# Altium footprint library Standard2.PcbLib: 423 footprints (part 5 of 27)
Each footprint in its own frame and in the unit in brackets; x right, y up, seen from the top. Pads: shape width x height; smd on the part's side, far side on the other; paste and mask are expansions set on the pad; w line width, h text height; cw(c..) or ccw(c..) is an arc to the next point about the centre after c.
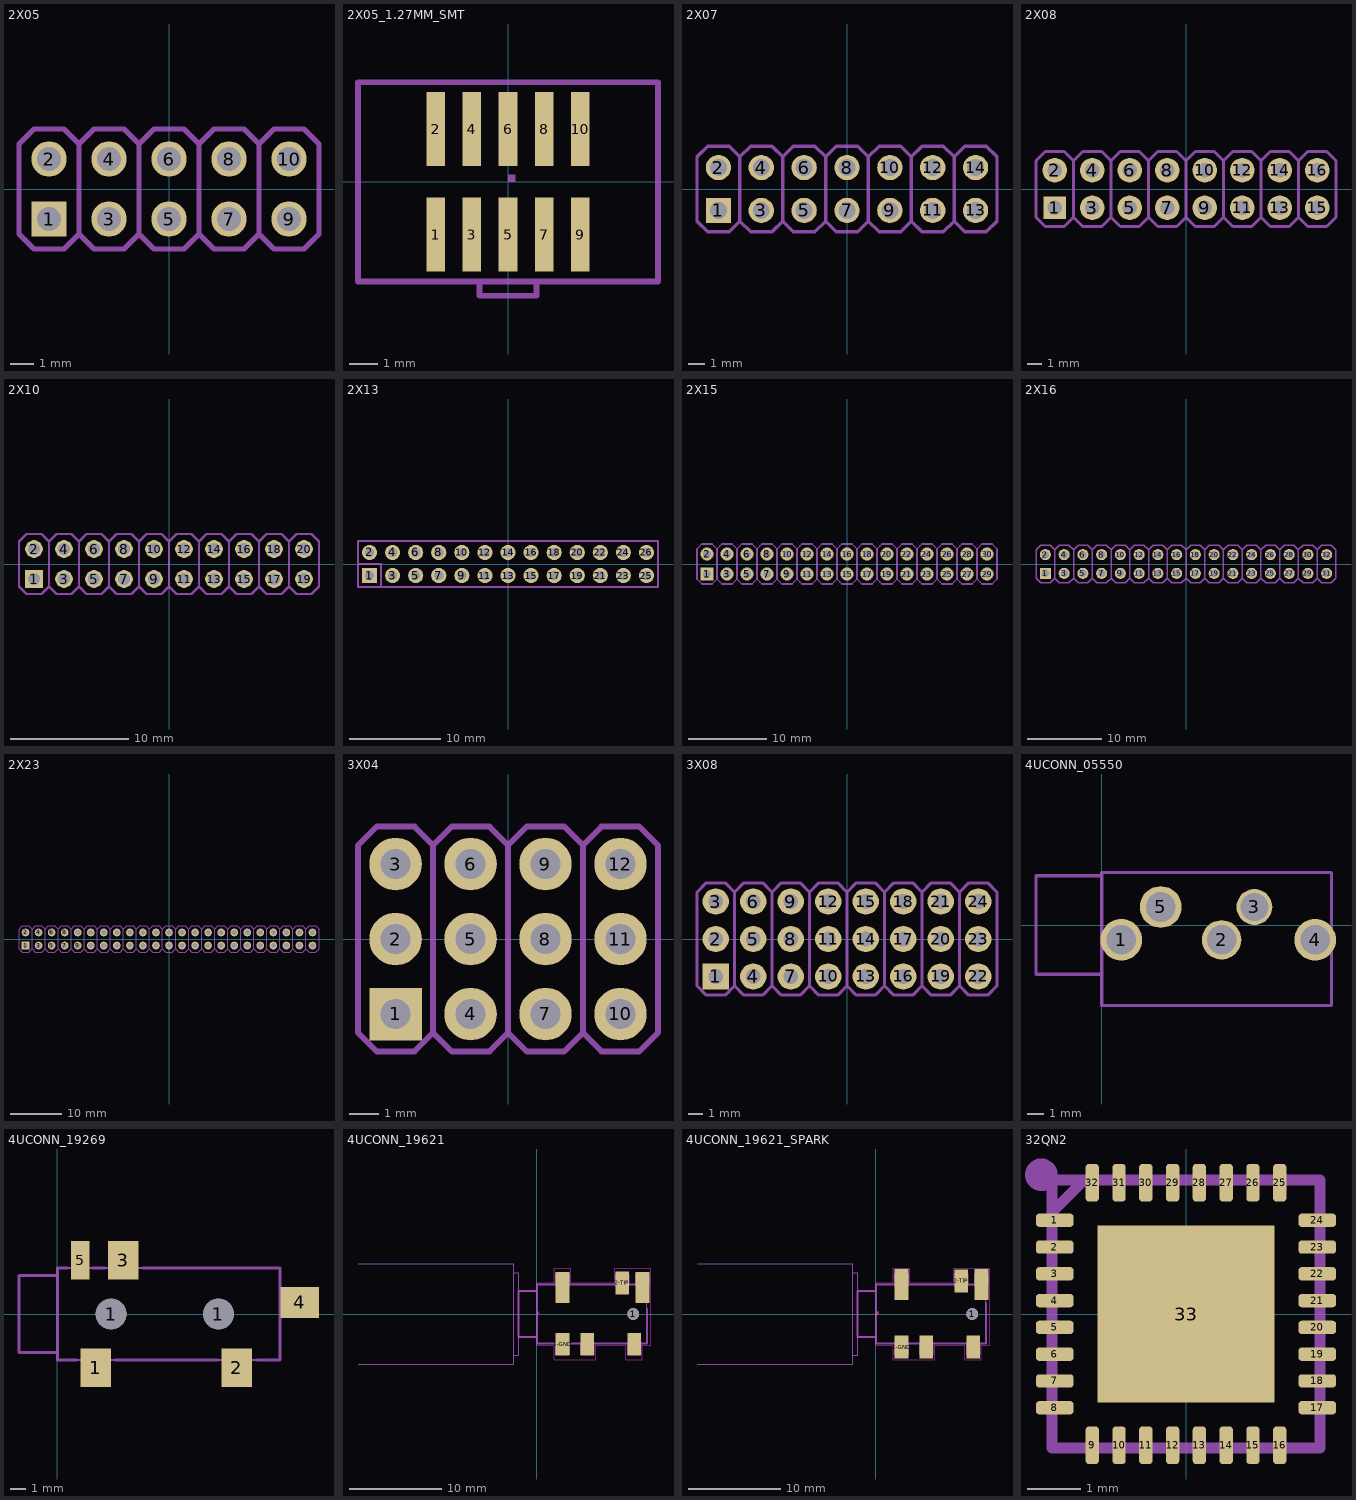
[diagram p4: the footprints below, top view; thin cyan lines are the x and y axes]

## 2X05 [mm]
pads (10):
  rect 1.5x1.5 hole 1: 1(-5.08,-1.27)
  round 1.5 hole 1: 2(-5.08,1.27) 3(-2.54,-1.27) 4(-2.54,1.27) 5(0,-1.27) 6(0,1.27) 7(2.54,-1.27) 8(2.54,1.27) 9(5.08,-1.27) 10(5.08,1.27)
Mechanical 2:
  lines w0.203: -3.81,-1.905 -4.445,-2.54 -5.715,-2.54 -6.35,-1.905 -6.35,1.905 -5.715,2.54 -4.445,2.54 -3.81,1.905 ; -3.81,-1.905 -3.175,-2.54 -1.905,-2.54 -1.27,-1.905 ; -3.81,-1.905 -3.81,1.905 ; -3.81,1.905 -3.175,2.54 -1.905,2.54 -1.27,1.905 ; -1.27,-1.905 -0.635,-2.54 0.635,-2.54 1.27,-1.905 ; -1.27,-1.905 -1.27,1.905 ; -1.27,1.905 -0.635,2.54 0.635,2.54 1.27,1.905 ; 1.27,-1.905 1.905,-2.54 3.175,-2.54 3.81,-1.905 ; 1.27,-1.905 1.27,1.905 ; 1.27,1.905 1.905,2.54 3.175,2.54 3.81,1.905 ; 3.81,-1.905 3.81,1.905 ; 3.81,-1.905 4.445,-2.54 5.715,-2.54 6.35,-1.905 6.35,1.905 5.715,2.54 4.445,2.54 3.81,1.905
Mechanical 18:
  rectangle: -5.334,-1.524 -4.826,-1.016
  rectangle: -5.334,1.016 -4.826,1.524
  rectangle: -2.794,1.016 -2.286,1.524
  rectangle: -2.794,-1.524 -2.286,-1.016
  rectangle: -0.254,1.016 0.254,1.524
  rectangle: -0.254,-1.524 0.254,-1.016
  rectangle: 2.286,1.016 2.794,1.524
  rectangle: 2.286,-1.524 2.794,-1.016
  rectangle: 4.826,1.016 5.334,1.524
  rectangle: 4.826,-1.524 5.334,-1.016

## 2X05_1.27MM_SMT [mm]
pads (10):
  rect 0.65x2.6 smd: 1(-2.54,-1.85) 2(-2.54,1.85) 3(-1.27,-1.85) 4(-1.27,1.85) 5(0,-1.85) 6(0,1.85) 7(1.27,-1.85) 8(1.27,1.85) 9(2.54,-1.85) 10(2.54,1.85)
Mechanical 2:
  region: 0,0 0.254,0 0.254,0.254 0,0.254
  lines w0.203: -1,-3.5 1,-3.5 ; -1,-3.5 -5.27,-3.5 -5.27,3.5 5.27,3.5 5.27,-3.5 1,-3.5 ; -1,-3.5 -1,-4 1,-4 1,-3.5

## 2X07 [mm]
pads (14):
  rect 1.5x1.5 hole 1: 1(-7.62,-1.27)
  round 1.5 hole 1: 2(-7.62,1.27) 3(-5.08,-1.27) 4(-5.08,1.27) 5(-2.54,-1.27) 6(-2.54,1.27) 7(0,-1.27) 8(0,1.27) 9(2.54,-1.27) 10(2.54,1.27) 11(5.08,-1.27) 12(5.08,1.27) 13(7.62,-1.27) 14(7.62,1.27)
Mechanical 2:
  lines w0.203: -6.35,-1.905 -6.985,-2.54 -8.255,-2.54 -8.89,-1.905 -8.89,1.905 -8.255,2.54 -6.985,2.54 -6.35,1.905 ; -6.35,-1.905 -5.715,-2.54 -4.445,-2.54 -3.81,-1.905 ; -6.35,-1.905 -6.35,1.905 ; -6.35,1.905 -5.715,2.54 -4.445,2.54 -3.81,1.905 ; -3.81,-1.905 -3.175,-2.54 -1.905,-2.54 -1.27,-1.905 ; -3.81,-1.905 -3.81,1.905 ; -3.81,1.905 -3.175,2.54 -1.905,2.54 -1.27,1.905 ; -1.27,-1.905 -0.635,-2.54 0.635,-2.54 1.27,-1.905 ; -1.27,-1.905 -1.27,1.905 ; -1.27,1.905 -0.635,2.54 0.635,2.54 1.27,1.905 ; 1.27,-1.905 1.905,-2.54 3.175,-2.54 3.81,-1.905 ; 1.27,-1.905 1.27,1.905 ; 1.27,1.905 1.905,2.54 3.175,2.54 3.81,1.905 ; 3.81,-1.905 4.445,-2.54 5.715,-2.54 6.35,-1.905 ; 3.81,-1.905 3.81,1.905 ; 3.81,1.905 4.445,2.54 5.715,2.54 6.35,1.905 ; 6.35,-1.905 6.35,1.905 ; 6.35,-1.905 6.985,-2.54 8.255,-2.54 8.89,-1.905 8.89,1.905 8.255,2.54 6.985,2.54 6.35,1.905
Mechanical 18:
  rectangle: -7.874,-1.524 -7.366,-1.016
  rectangle: -7.874,1.016 -7.366,1.524
  rectangle: -5.334,1.016 -4.826,1.524
  rectangle: -5.334,-1.524 -4.826,-1.016
  rectangle: -2.794,1.016 -2.286,1.524
  rectangle: -2.794,-1.524 -2.286,-1.016
  rectangle: -0.254,1.016 0.254,1.524
  rectangle: 2.286,1.016 2.794,1.524
  rectangle: 4.826,1.016 5.334,1.524
  rectangle: -0.254,-1.524 0.254,-1.016
  rectangle: 2.286,-1.524 2.794,-1.016
  rectangle: 4.826,-1.524 5.334,-1.016
  rectangle: 7.366,1.016 7.874,1.524
  rectangle: 7.366,-1.524 7.874,-1.016

## 2X08 [mil]
pads (16):
  rect 59.05x59.05 hole 39.37: 1(-350,-50)
  round 66 hole 39.37: 2(-350,50) 3(-250,-50) 4(-250,50) 5(-150,-50) 6(-150,50) 7(-50,-50) 8(-50,50) 9(50,-50) 10(50,50) 11(150,-50) 12(150,50) 13(250,-50) 14(250,50) 15(350,-50) 16(350,50)
Mechanical 2:
  lines w8: -300,-75 -325,-100 -375,-100 -400,-75 -400,75 -375,100 -325,100 -300,75 ; -300,-75 -275,-100 -225,-100 -200,-75 ; -300,-75 -300,75 ; -300,75 -275,100 -225,100 -200,75 ; -200,-75 -175,-100 -125,-100 -100,-75 ; -200,-75 -200,75 ; -200,75 -175,100 -125,100 -100,75 ; -100,-75 -75,-100 -25,-100 0,-75 ; -100,-75 -100,75 ; -100,75 -75,100 -25,100 0,75 ; 0,-75 25,-100 75,-100 100,-75 ; 0,-75 0,75 ; 0,75 25,100 75,100 100,75 ; 100,-75 125,-100 175,-100 200,-75 ; 100,-75 100,75 ; 100,75 125,100 175,100 200,75 ; 200,-75 200,75 ; 200,-75 225,-100 275,-100 300,-75 ; 200,75 225,100 275,100 300,75 ; 300,-75 300,75 ; 300,-75 325,-100 375,-100 400,-75 400,75 375,100 325,100 300,75
Mechanical 18:
  rectangle: -360,-60 -340,-40
  rectangle: -360,40 -340,60
  rectangle: -260,40 -240,60
  rectangle: -260,-60 -240,-40
  rectangle: -160,40 -140,60
  rectangle: -160,-60 -140,-40
  rectangle: -60,40 -40,60
  rectangle: 40,40 60,60
  rectangle: 140,40 160,60
  rectangle: -60,-60 -40,-40
  rectangle: 40,-60 60,-40
  rectangle: 140,-60 160,-40
  rectangle: 240,40 260,60
  rectangle: 240,-60 260,-40
  rectangle: 340,40 360,60
  rectangle: 340,-60 360,-40

## 2X10 [mm]
pads (20):
  rect 1.5x1.5 hole 1: 1(-11.43,-1.27)
  round 1.5 hole 1: 2(-11.43,1.27) 3(-8.89,-1.27) 4(-8.89,1.27) 5(-6.35,-1.27) 6(-6.35,1.27) 7(-3.81,-1.27) 8(-3.81,1.27) 9(-1.27,-1.27) 10(-1.27,1.27) 11(1.27,-1.27) 12(1.27,1.27) 13(3.81,-1.27) 14(3.81,1.27) 15(6.35,-1.27) 16(6.35,1.27) 17(8.89,-1.27) 18(8.89,1.27) 19(11.43,-1.27) 20(11.43,1.27)
Mechanical 2:
  lines w0.203: -10.16,-1.905 -10.795,-2.54 -12.065,-2.54 -12.7,-1.905 -12.7,1.905 -12.065,2.54 -10.795,2.54 -10.16,1.905 ; -10.16,-1.905 -9.525,-2.54 -8.255,-2.54 -7.62,-1.905 ; -10.16,-1.905 -10.16,1.905 ; -10.16,1.905 -9.525,2.54 -8.255,2.54 -7.62,1.905 ; -7.62,-1.905 -6.985,-2.54 -5.715,-2.54 -5.08,-1.905 ; -7.62,-1.905 -7.62,1.905 ; -7.62,1.905 -6.985,2.54 -5.715,2.54 -5.08,1.905 ; -5.08,-1.905 -4.445,-2.54 -3.175,-2.54 -2.54,-1.905 ; -5.08,-1.905 -5.08,1.905 ; -5.08,1.905 -4.445,2.54 -3.175,2.54 -2.54,1.905 ; -2.54,-1.905 -1.905,-2.54 -0.635,-2.54 0,-1.905 ; -2.54,-1.905 -2.54,1.905 ; -2.54,1.905 -1.905,2.54 -0.635,2.54 0,1.905 ; 0,-1.905 0.635,-2.54 1.905,-2.54 2.54,-1.905 ; 0,-1.905 0,1.905 ; 0,1.905 0.635,2.54 1.905,2.54 2.54,1.905 ; 2.54,-1.905 3.175,-2.54 4.445,-2.54 5.08,-1.905 ; 2.54,-1.905 2.54,1.905 ; 2.54,1.905 3.175,2.54 4.445,2.54 5.08,1.905 ; 5.08,-1.905 5.715,-2.54 6.985,-2.54 7.62,-1.905 ; 5.08,-1.905 5.08,1.905 ; 5.08,1.905 5.715,2.54 6.985,2.54 7.62,1.905 ; 7.62,-1.905 8.255,-2.54 9.525,-2.54 10.16,-1.905 ; 7.62,-1.905 7.62,1.905 ; 7.62,1.905 8.255,2.54 9.525,2.54 10.16,1.905 ; 10.16,-1.905 10.16,1.905 ; 10.16,-1.905 10.795,-2.54 12.065,-2.54 12.7,-1.905 12.7,1.905 12.065,2.54 10.795,2.54 10.16,1.905
Mechanical 18:
  rectangle: -11.684,-1.524 -11.176,-1.016
  rectangle: -11.684,1.016 -11.176,1.524
  rectangle: -9.144,1.016 -8.636,1.524
  rectangle: -9.144,-1.524 -8.636,-1.016
  rectangle: -6.604,1.016 -6.096,1.524
  rectangle: -6.604,-1.524 -6.096,-1.016
  rectangle: -4.064,1.016 -3.556,1.524
  rectangle: -1.524,1.016 -1.016,1.524
  rectangle: 1.016,1.016 1.524,1.524
  rectangle: -4.064,-1.524 -3.556,-1.016
  rectangle: -1.524,-1.524 -1.016,-1.016
  rectangle: 1.016,-1.524 1.524,-1.016
  rectangle: 3.556,1.016 4.064,1.524
  rectangle: 3.556,-1.524 4.064,-1.016
  rectangle: 6.096,1.016 6.604,1.524
  rectangle: 6.096,-1.524 6.604,-1.016
  rectangle: 8.636,1.016 9.144,1.524
  rectangle: 8.636,-1.524 9.144,-1.016
  rectangle: 11.176,1.016 11.684,1.524
  rectangle: 11.176,-1.524 11.684,-1.016

## 2X13 [mil]
pads (26):
  rect 66x66 hole 39.37: 1(-600,-50)
  round 66 hole 39.37: 2(-600,50) 3(-500,-50) 4(-500,50) 5(-400,-50) 6(-400,50) 7(-300,-50) 8(-300,50) 9(-200,-50) 10(-200,50) 11(-100,-50) 12(-100,50) 13(0,-50) 14(0,50) 15(100,-50) 16(100,50) 17(200,-50) 18(200,50) 19(300,-50) 20(300,50) 21(400,-50) 22(400,50) 23(500,-50) 24(500,50) 25(600,-50) 26(600,50)
Mechanical 2:
  lines w8: -650,0 -650,-100 -550,-100 ; -650,0 -650,100 650,100 650,-100 -550,-100 ; -650,0 -550,0 -550,-100
Mechanical 18:
  rectangle: -610,-60 -590,-40
  rectangle: -610,40 -590,60
  rectangle: -510,40 -490,60
  rectangle: -510,-60 -490,-40
  rectangle: -410,40 -390,60
  rectangle: -410,-60 -390,-40
  rectangle: -310,40 -290,60
  rectangle: -210,40 -190,60
  rectangle: -110,40 -90,60
  rectangle: -310,-60 -290,-40
  rectangle: -210,-60 -190,-40
  rectangle: -110,-60 -90,-40
  rectangle: -10,40 10,60
  rectangle: -10,-60 10,-40
  rectangle: 90,40 110,60
  rectangle: 90,-60 110,-40
  rectangle: 190,40 210,60
  rectangle: 190,-60 210,-40
  rectangle: 290,40 310,60
  rectangle: 290,-60 310,-40
  rectangle: 390,40 410,60
  rectangle: 390,-60 410,-40
  rectangle: 490,40 510,60
  rectangle: 490,-60 510,-40
  rectangle: 590,40 610,60
  rectangle: 590,-60 610,-40

## 2X15 [mil]
pads (30):
  rect 66x66 hole 39.37: 1(-700,-50)
  round 66 hole 39.37: 2(-700,50) 3(-600,-50) 4(-600,50) 5(-500,-50) 6(-500,50) 7(-400,-50) 8(-400,50) 9(-300,-50) 10(-300,50) 11(-200,-50) 12(-200,50) 13(-100,-50) 14(-100,50) 15(0,-50) 16(0,50) 17(100,-50) 18(100,50) 19(200,-50) 20(200,50) 21(300,-50) 22(300,50) 23(400,-50) 24(400,50) 25(500,-50) 26(500,50) 27(600,-50) 28(600,50) 29(700,-50) 30(700,50)
Mechanical 2:
  lines w8: -650,-75 -675,-100 -725,-100 -750,-75 -750,75 -725,100 -675,100 -650,75 ; -650,-75 -625,-100 -575,-100 -550,-75 ; -650,-75 -650,75 ; -650,75 -625,100 -575,100 -550,75 ; -550,-75 -525,-100 -475,-100 -450,-75 ; -550,-75 -550,75 ; -550,75 -525,100 -475,100 -450,75 ; -450,-75 -425,-100 -375,-100 -350,-75 ; -450,-75 -450,75 ; -450,75 -425,100 -375,100 -350,75 ; -350,-75 -325,-100 -275,-100 -250,-75 ; -350,-75 -350,75 ; -350,75 -325,100 -275,100 -250,75 ; -250,-75 -225,-100 -175,-100 -150,-75 ; -250,-75 -250,75 ; -250,75 -225,100 -175,100 -150,75 ; -150,-75 -125,-100 -75,-100 -50,-75 ; -150,-75 -150,75 ; -150,75 -125,100 -75,100 -50,75 ; -50,-75 -25,-100 25,-100 50,-75 ; -50,-75 -50,75 ; -50,75 -25,100 25,100 50,75 ; 50,-75 75,-100 125,-100 150,-75 ; 50,-75 50,75 ; 50,75 75,100 125,100 150,75 ; 150,-75 175,-100 225,-100 250,-75 ; 150,-75 150,75 ; 150,75 175,100 225,100 250,75 ; 250,-75 275,-100 325,-100 350,-75 ; 250,-75 250,75 ; 250,75 275,100 325,100 350,75 ; 350,-75 375,-100 425,-100 450,-75 ; 350,-75 350,75 ; 350,75 375,100 425,100 450,75 ; 450,-75 475,-100 525,-100 550,-75 ; 450,-75 450,75 ; 450,75 475,100 525,100 550,75 ; 550,-75 575,-100 625,-100 650,-75 ; 550,-75 550,75 ; 550,75 575,100 625,100 650,75 ; 650,-75 675,-100 725,-100 750,-75 750,75 725,100 675,100 650,75 ; 650,-75 650,75
Mechanical 18:
  rectangle: -710,-60 -690,-40
  rectangle: -710,40 -690,60
  rectangle: -610,40 -590,60
  rectangle: -610,-60 -590,-40
  rectangle: -510,40 -490,60
  rectangle: -510,-60 -490,-40
  rectangle: -410,40 -390,60
  rectangle: -310,40 -290,60
  rectangle: -210,40 -190,60
  rectangle: -410,-60 -390,-40
  rectangle: -310,-60 -290,-40
  rectangle: -210,-60 -190,-40
  rectangle: -110,40 -90,60
  rectangle: -110,-60 -90,-40
  rectangle: -10,40 10,60
  rectangle: -10,-60 10,-40
  rectangle: 90,40 110,60
  rectangle: 90,-60 110,-40
  rectangle: 190,40 210,60
  rectangle: 190,-60 210,-40
  rectangle: 290,40 310,60
  rectangle: 290,-60 310,-40
  rectangle: 390,40 410,60
  rectangle: 390,-60 410,-40
  rectangle: 490,40 510,60
  rectangle: 490,-60 510,-40
  rectangle: 590,40 610,60
  rectangle: 590,-60 610,-40
  rectangle: 690,40 710,60
  rectangle: 690,-60 710,-40

## 2X16 [mm]
pads (32):
  rect 1.5x1.5 hole 1: 1(-19.05,-1.27)
  round 1.5 hole 1: 2(-19.05,1.27) 3(-16.51,-1.27) 4(-16.51,1.27) 5(-13.97,-1.27) 6(-13.97,1.27) 7(-11.43,-1.27) 8(-11.43,1.27) 9(-8.89,-1.27) 10(-8.89,1.27) 11(-6.35,-1.27) 12(-6.35,1.27) 13(-3.81,-1.27) 14(-3.81,1.27) 15(-1.27,-1.27) 16(-1.27,1.27) 17(1.27,-1.27) 18(1.27,1.27) 19(3.81,-1.27) 20(3.81,1.27) 21(6.35,-1.27) 22(6.35,1.27) 23(8.89,-1.27) 24(8.89,1.27) 25(11.43,-1.27) 26(11.43,1.27) 27(13.97,-1.27) 28(13.97,1.27) 29(16.51,-1.27) 30(16.51,1.27) 31(19.05,-1.27) 32(19.05,1.27)
Mechanical 2:
  lines w0.203: -17.78,-1.905 -18.415,-2.54 -19.685,-2.54 -20.32,-1.905 -20.32,1.905 -19.685,2.54 -18.415,2.54 -17.78,1.905 ; -17.78,-1.905 -17.145,-2.54 -15.875,-2.54 -15.24,-1.905 ; -17.78,-1.905 -17.78,1.905 ; -17.78,1.905 -17.145,2.54 -15.875,2.54 -15.24,1.905 ; -15.24,-1.905 -14.605,-2.54 -13.335,-2.54 -12.7,-1.905 ; -15.24,-1.905 -15.24,1.905 ; -15.24,1.905 -14.605,2.54 -13.335,2.54 -12.7,1.905 ; -12.7,-1.905 -12.065,-2.54 -10.795,-2.54 -10.16,-1.905 ; -12.7,-1.905 -12.7,1.905 ; -12.7,1.905 -12.065,2.54 -10.795,2.54 -10.16,1.905 ; -10.16,-1.905 -9.525,-2.54 -8.255,-2.54 -7.62,-1.905 ; -10.16,-1.905 -10.16,1.905 ; -10.16,1.905 -9.525,2.54 -8.255,2.54 -7.62,1.905 ; -7.62,-1.905 -6.985,-2.54 -5.715,-2.54 -5.08,-1.905 ; -7.62,-1.905 -7.62,1.905 ; -7.62,1.905 -6.985,2.54 -5.715,2.54 -5.08,1.905 ; -5.08,-1.905 -4.445,-2.54 -3.175,-2.54 -2.54,-1.905 ; -5.08,-1.905 -5.08,1.905 ; -5.08,1.905 -4.445,2.54 -3.175,2.54 -2.54,1.905 ; -2.54,-1.905 -1.905,-2.54 -0.635,-2.54 0,-1.905 ; -2.54,-1.905 -2.54,1.905 ; -2.54,1.905 -1.905,2.54 -0.635,2.54 0,1.905 ; 0,-1.905 0.635,-2.54 1.905,-2.54 2.54,-1.905 ; 0,-1.905 0,1.905 ; 0,1.905 0.635,2.54 1.905,2.54 2.54,1.905 ; 2.54,-1.905 3.175,-2.54 4.445,-2.54 5.08,-1.905 ; 2.54,-1.905 2.54,1.905 ; 2.54,1.905 3.175,2.54 4.445,2.54 5.08,1.905 ; 5.08,-1.905 5.715,-2.54 6.985,-2.54 7.62,-1.905 ; 5.08,-1.905 5.08,1.905 ; 5.08,1.905 5.715,2.54 6.985,2.54 7.62,1.905 ; 7.62,-1.905 8.255,-2.54 9.525,-2.54 10.16,-1.905 ; 7.62,-1.905 7.62,1.905 ; 7.62,1.905 8.255,2.54 9.525,2.54 10.16,1.905 ; 10.16,-1.905 10.795,-2.54 12.065,-2.54 12.7,-1.905 ; 10.16,-1.905 10.16,1.905 ; 10.16,1.905 10.795,2.54 12.065,2.54 12.7,1.905 ; 12.7,-1.905 13.335,-2.54 14.605,-2.54 15.24,-1.905 ; 12.7,-1.905 12.7,1.905 ; 12.7,1.905 13.335,2.54 14.605,2.54 15.24,1.905 ; 15.24,-1.905 15.875,-2.54 17.145,-2.54 17.78,-1.905 ; 15.24,-1.905 15.24,1.905 ; 15.24,1.905 15.875,2.54 17.145,2.54 17.78,1.905 ; 17.78,-1.905 18.415,-2.54 19.685,-2.54 20.32,-1.905 20.32,1.905 19.685,2.54 18.415,2.54 17.78,1.905 ; 17.78,-1.905 17.78,1.905
Mechanical 18:
  rectangle: -19.304,-1.524 -18.796,-1.016
  rectangle: -19.304,1.016 -18.796,1.524
  rectangle: -16.764,1.016 -16.256,1.524
  rectangle: -16.764,-1.524 -16.256,-1.016
  rectangle: -14.224,1.016 -13.716,1.524
  rectangle: -14.224,-1.524 -13.716,-1.016
  rectangle: -11.684,1.016 -11.176,1.524
  rectangle: -9.144,1.016 -8.636,1.524
  rectangle: -6.604,1.016 -6.096,1.524
  rectangle: -11.684,-1.524 -11.176,-1.016
  rectangle: -9.144,-1.524 -8.636,-1.016
  rectangle: -6.604,-1.524 -6.096,-1.016
  rectangle: -4.064,1.016 -3.556,1.524
  rectangle: -4.064,-1.524 -3.556,-1.016
  rectangle: -1.524,1.016 -1.016,1.524
  rectangle: -1.524,-1.524 -1.016,-1.016
  rectangle: 1.016,1.016 1.524,1.524
  rectangle: 1.016,-1.524 1.524,-1.016
  rectangle: 3.556,1.016 4.064,1.524
  rectangle: 3.556,-1.524 4.064,-1.016
  rectangle: 6.096,1.016 6.604,1.524
  rectangle: 6.096,-1.524 6.604,-1.016
  rectangle: 8.636,1.016 9.144,1.524
  rectangle: 8.636,-1.524 9.144,-1.016
  rectangle: 11.176,1.016 11.684,1.524
  rectangle: 11.176,-1.524 11.684,-1.016
  rectangle: 13.716,1.016 14.224,1.524
  rectangle: 13.716,-1.524 14.224,-1.016
  rectangle: 16.256,1.016 16.764,1.524
  rectangle: 16.256,-1.524 16.764,-1.016
  rectangle: 18.796,1.016 19.304,1.524
  rectangle: 18.796,-1.524 19.304,-1.016

## 2X23 [mm]
pads (46):
  rect 1.5x1.5 hole 1: 1(-27.94,-1.27)
  round 1.5 hole 1: 2(-27.94,1.27) 3(-25.4,-1.27) 4(-25.4,1.27) 5(-22.86,-1.27) 6(-22.86,1.27) 7(-20.32,-1.27) 8(-20.32,1.27) 9(-17.78,-1.27) 10(-17.78,1.27) 11(-15.24,-1.27) 12(-15.24,1.27) 13(-12.7,-1.27) 14(-12.7,1.27) 15(-10.16,-1.27) 16(-10.16,1.27) 17(-7.62,-1.27) 18(-7.62,1.27) 19(-5.08,-1.27) 20(-5.08,1.27) 21(-2.54,-1.27) 22(-2.54,1.27) 23(0,-1.27) 24(0,1.27) 25(2.54,-1.27) 26(2.54,1.27) 27(5.08,-1.27) 28(5.08,1.27) 29(7.62,-1.27) 30(7.62,1.27) 31(10.16,-1.27) 32(10.16,1.27) 33(12.7,-1.27) 34(12.7,1.27) 35(15.24,-1.27) 36(15.24,1.27) 37(17.78,-1.27) 38(17.78,1.27) 39(20.32,-1.27) 40(20.32,1.27) 41(22.86,-1.27) 42(22.86,1.27) 43(25.4,-1.27) 44(25.4,1.27) 45(27.94,-1.27) 46(27.94,1.27)
Mechanical 2:
  drawing of 162 lines, arcs and shapes, not listed
Mechanical 18:
  rectangle: -28.194,-1.524 -27.686,-1.016
  rectangle: -28.194,1.016 -27.686,1.524
  rectangle: -25.654,1.016 -25.146,1.524
  rectangle: -25.654,-1.524 -25.146,-1.016
  rectangle: -23.114,1.016 -22.606,1.524
  rectangle: -23.114,-1.524 -22.606,-1.016
  rectangle: -20.574,1.016 -20.066,1.524
  rectangle: -18.034,1.016 -17.526,1.524
  rectangle: -15.494,1.016 -14.986,1.524
  rectangle: -20.574,-1.524 -20.066,-1.016
  rectangle: -18.034,-1.524 -17.526,-1.016
  rectangle: -15.494,-1.524 -14.986,-1.016
  rectangle: -12.954,1.016 -12.446,1.524
  rectangle: -12.954,-1.524 -12.446,-1.016
  rectangle: -10.414,1.016 -9.906,1.524
  rectangle: -10.414,-1.524 -9.906,-1.016
  rectangle: -7.874,1.016 -7.366,1.524
  rectangle: -7.874,-1.524 -7.366,-1.016
  rectangle: -5.334,1.016 -4.826,1.524
  rectangle: -5.334,-1.524 -4.826,-1.016
  rectangle: -2.794,1.016 -2.286,1.524
  rectangle: -2.794,-1.524 -2.286,-1.016
  rectangle: -0.254,1.016 0.254,1.524
  rectangle: -0.254,-1.524 0.254,-1.016
  rectangle: 2.286,1.016 2.794,1.524
  rectangle: 2.286,-1.524 2.794,-1.016
  rectangle: 4.826,1.016 5.334,1.524
  rectangle: 4.826,-1.524 5.334,-1.016
  rectangle: 7.366,1.016 7.874,1.524
  rectangle: 7.366,-1.524 7.874,-1.016
  rectangle: 9.906,1.016 10.414,1.524
  rectangle: 9.906,-1.524 10.414,-1.016
  rectangle: 12.446,1.016 12.954,1.524
  rectangle: 12.446,-1.524 12.954,-1.016
  rectangle: 14.986,1.016 15.494,1.524
  rectangle: 14.986,-1.524 15.494,-1.016
  rectangle: 17.526,1.016 18.034,1.524
  rectangle: 17.526,-1.524 18.034,-1.016
  rectangle: 20.066,1.016 20.574,1.524
  rectangle: 20.066,-1.524 20.574,-1.016
  rectangle: 22.606,1.016 23.114,1.524
  rectangle: 22.606,-1.524 23.114,-1.016
  rectangle: 25.146,1.016 25.654,1.524
  rectangle: 25.146,-1.524 25.654,-1.016
  rectangle: 27.686,1.016 28.194,1.524
  rectangle: 27.686,-1.524 28.194,-1.016

## 3X04 [mil]
pads (12):
  rect 70x70 hole 39.37: 1(-150,-100)
  round 70 hole 39.37: 2(-150,0) 3(-150,100) 4(-50,-100) 5(-50,0) 6(-50,100) 7(50,-100) 8(50,0) 9(50,100) 10(150,-100) 11(150,0) 12(150,100)
Mechanical 2:
  lines w8: -100,-125 -125,-150 -175,-150 -200,-125 -200,125 -175,150 -125,150 -100,125 ; -100,-125 -75,-150 -25,-150 0,-125 ; -100,-125 -100,125 ; -100,125 -75,150 -25,150 0,125 ; 0,-125 25,-150 75,-150 100,-125 ; 0,-125 0,125 ; 0,125 25,150 75,150 100,125 ; 100,-125 125,-150 175,-150 200,-125 200,125 175,150 125,150 100,125 ; 100,-125 100,125
Mechanical 18:
  rectangle: -160,-110 -140,-90
  rectangle: -160,-10 -140,10
  rectangle: -60,-10 -40,10
  rectangle: -60,-110 -40,-90
  rectangle: 40,-10 60,10
  rectangle: 40,-110 60,-90
  rectangle: 140,-10 160,10
  rectangle: 140,-110 160,-90
  rectangle: -160,90 -140,110
  rectangle: -60,90 -40,110
  rectangle: 40,90 60,110
  rectangle: 140,90 160,110

## 3X08 [mil]
pads (24):
  rect 70x70 hole 39.37: 1(-350,-100)
  round 70 hole 39.37: 2(-350,0) 3(-350,100) 4(-250,-100) 5(-250,0) 6(-250,100) 7(-150,-100) 8(-150,0) 9(-150,100) 10(-50,-100) 11(-50,0) 12(-50,100) 13(50,-100) 14(50,0) 15(50,100) 16(150,-100) 17(150,0) 18(150,100) 19(250,-100) 20(250,0) 21(250,100) 22(350,-100) 23(350,0) 24(350,100)
Mechanical 2:
  lines w8: -300,-125 -325,-150 -375,-150 -400,-125 -400,125 -375,150 -325,150 -300,125 ; -300,-125 -275,-150 -225,-150 -200,-125 ; -300,-125 -300,125 ; -300,125 -275,150 -225,150 -200,125 ; -200,-125 -175,-150 -125,-150 -100,-125 ; -200,-125 -200,125 ; -200,125 -175,150 -125,150 -100,125 ; -100,-125 -75,-150 -25,-150 0,-125 ; -100,-125 -100,125 ; -100,125 -75,150 -25,150 0,125 ; 0,-125 25,-150 75,-150 100,-125 ; 0,-125 0,125 ; 0,125 25,150 75,150 100,125 ; 100,-125 125,-150 175,-150 200,-125 ; 100,-125 100,125 ; 100,125 125,150 175,150 200,125 ; 200,-125 200,125 ; 200,-125 225,-150 275,-150 300,-125 ; 200,125 225,150 275,150 300,125 ; 300,-125 300,125 ; 300,-125 325,-150 375,-150 400,-125 400,125 375,150 325,150 300,125
Mechanical 18:
  rectangle: -360,-110 -340,-90
  rectangle: -360,-10 -340,10
  rectangle: -260,-10 -240,10
  rectangle: -260,-110 -240,-90
  rectangle: -160,-10 -140,10
  rectangle: -160,-110 -140,-90
  rectangle: -60,-10 -40,10
  rectangle: 40,-10 60,10
  rectangle: 140,-10 160,10
  rectangle: -60,-110 -40,-90
  rectangle: 40,-110 60,-90
  rectangle: 140,-110 160,-90
  rectangle: 240,-10 260,10
  rectangle: 240,-110 260,-90
  rectangle: 340,-10 360,10
  rectangle: 340,-110 360,-90
  rectangle: -360,90 -340,110
  rectangle: -260,90 -240,110
  rectangle: -160,90 -140,110
  rectangle: -60,90 -40,110
  rectangle: 40,90 60,110
  rectangle: 140,90 160,110
  rectangle: 240,90 260,110
  rectangle: 340,90 360,110

## 4UCONN_05550 [mil]
pads (5):
  round 100 hole 70.87: 1(47.24,-35.43) 4(511.81,-35.43) 5(141.73,43.31)
  round 94.49 hole 70.87: 2(287.4,-35.43)
  round 86 hole 66.93: 3(366.14,43.31)
Mechanical 2:
  lines w8: 0,-192.91 551.18,-192.91 551.18,-110.24 ; 0,125.98 551.18,125.98 551.18,43.31
Mechanical 18:
  lines w5: 0,-192.91 551.18,-192.91 ; 0,125.98 551.18,125.98
  lines w8: 0,-192.91 0,-118.11 ; 0,125.98 0,118.11 ; 551.18,-192.91 551.18,125.98 ; 0,-118.11 0,118.11 ; 0,-118.11 -157.48,-118.11 -157.48,118.11 0,118.11

## 4UCONN_19269 [mm]
pads (7):
  rect 2x2.5 smd: 1(2.5,-3.5) 2(11.7,-3.5) 3(4.3,3.5)
  round 2 hole 2: 1(3.5,0) 1(10.5,0)
  rect 2.5x2 smd: 4(15.8,0.75)
  rect 1.2x2.5 smd: 5(1.5,3.5)
Mechanical 2:
  lines w0.203: 0,-3 0,3 0.7,3 ; 0.05,-3 1.25,-3 ; 2.3,3 3.1,3 ; 3.75,-3 10.45,-3 ; 5.55,3 14.5,3 14.5,2 ; 13,-3 14.5,-3 14.5,-0.5
Mechanical 18:
  rectangle: 3.5,3 5.1,4.4
  rectangle: 1.7,-4.45 3.3,-3.05
  rectangle: 10.9,-4.45 12.5,-3.05
  region: 15.95,-0.05 15.95,1.55 14.55,1.55 14.55,-0.05
  rectangle: 1.05,3 1.95,4.4
  lines w0.127: 0,-3 14.5,-3 ; 0,3 14.5,3
  lines w0.203: 0,-3 0,-2.5 ; 0,2.95 0,2.5 ; 14.5,-3 14.5,3 ; 0,-2.5 0,2.5 ; 0,-2.5 -2.5,-2.5 -2.5,2.5 0,2.5

## 4UCONN_19621 [mm]
pads (7):
  round 1.3 hole 1.3: 1(10.5,0)
  rect 1.5x2.5 smd: 1-GND(2.8,-3.3) 2-TIP(9.3,3.4) 3-OUTER_SLEEVE(5.5,-3.3) 6-OUTER_SLEEVE_BREAK(10.6,-3.3)
  rect 1.5x3.4 smd: 4-INNER_SLEEVE(2.8,2.9) 5-TIP_BREAK(11.5,2.9)
Keep-Out Layer:
  region: 0,0 0.254,0 0.254,0.254 0,0.254
  lines w0.05: -2,-2.5 0,-2.5 0,-3.4 1.9,-3.4 1.9,-5 6.4,-5 6.4,-3.4 9.7,-3.4 9.7,-5 11.5,-5 11.5,-3.4 12.4,-3.4 12.4,5 8.5,5 8.5,3.4 3.7,3.4 3.7,5 1.9,5 1.9,3.4 0,3.4 0,2.5 -2,2.5 -2,-2.5
Mechanical 2:
  lines w0.203: 1.5,-3.2 0,-3.2 0,3.2 1.6,3.2 ; 3.9,3.2 8,3.2 ; 6.8,-3.2 9.4,-3.2 ; 12,-3.2 12,0.55
Mechanical 18:
  rectangle: 2,3 3.6,4.4
  rectangle: 2,-4.45 3.6,-3.05
  rectangle: 9.8,-4.45 11.4,-3.05
  rectangle: 4.7,-4.45 6.3,-3.05
  rectangle: 8.5,3 10.1,4.4
  rectangle: 10.7,3 12.3,4.4
  lines w0.127: 0,-3.2 0,-2.5 0,2.5 ; 12,-3.2 12,3.2
  lines w0.203: 0,-3.2 12,-3.2 ; 0,-2.5 -2,-2.5 -2,2.5 0,2.5 0,3.2 12,3.2
Mechanical 40:
  lines w0.127: -19.5,-5.5 -2.5,-5.5 -2.5,-4.5 ; -19.5,5.5 -2.5,5.5 -2.5,4.5 ; -2.5,-4.5 -2.5,4.5 ; -2.5,-4.5 -2,-4.5 -2,4.5 -2.5,4.5

## 4UCONN_19621_SPARK [mm]
pads (7):
  round 1.3 hole 1.3: 1(10.5,0)
  rect 1.5x2.5 smd: 1-GND(2.8,-3.6) 2-TIP(9.3,3.6) 3-OUTER_SLEEVE(5.5,-3.6) 6-OUTER_SLEEVE_BREAK(10.6,-3.6)
  rect 1.5x3.4 smd: 4-INNER_SLEEVE(2.8,3.2) 5-TIP_BREAK(11.5,3.2)
Top Layer:
  region: 0,0 0.254,0 0.254,0.254 0,0.254
  region: 0,0 0.254,0 0.254,0.254 0,0.254
  region: 0,0 0.254,0 0.254,0.254 0,0.254
  region: 0,0 0.254,0 0.254,0.254 0,0.254
  region: 0,0 0.254,0 0.254,0.254 0,0.254
  region: 0,0 0.254,0 0.254,0.254 0,0.254
  region: 0,0 0.254,0 0.254,0.254 0,0.254
  region: 0,0 0.254,0 0.254,0.254 0,0.254
  region: 0,0 0.254,0 0.254,0.254 0,0.254
  region: 0,0 0.254,0 0.254,0.254 0,0.254
  region: 0,0 0.254,0 0.254,0.254 0,0.254
Top Solder:
  region: 0,0 0.254,0 0.254,0.254 0,0.254
  region: 0,0 0.254,0 0.254,0.254 0,0.254
  region: 0,0 0.254,0 0.254,0.254 0,0.254
Keep-Out Layer:
  region: 0,0 0.254,0 0.254,0.254 0,0.254
  lines w0.05: -2,-2.5 0,-2.5 0,-3.4 1.9,-3.4 1.9,-5 6.4,-5 6.4,-3.4 9.7,-3.4 9.7,-5 11.5,-5 11.5,-3.4 12.4,-3.4 12.4,5 8.5,5 8.5,3.4 3.7,3.4 3.7,5 1.9,5 1.9,3.4 0,3.4 0,2.5 -2,2.5 -2,-2.5
Mechanical 2:
  lines w0.203: 1.5,-3.2 0,-3.2 0,3.2 1.6,3.2 ; 3.9,3.2 8,3.2 ; 6.8,-3.2 9.4,-3.2 ; 12,-3.2 12,1.2
Mechanical 18:
  rectangle: 2,3 3.6,4.4
  rectangle: 2,-4.45 3.6,-3.05
  rectangle: 9.8,-4.45 11.4,-3.05
  rectangle: 4.7,-4.45 6.3,-3.05
  rectangle: 8.5,3 10.1,4.4
  rectangle: 10.7,3 12.3,4.4
  lines w0.127: 0,-3.2 0,-2.5 0,2.5 ; 12,-3.2 12,3.2
  lines w0.203: 0,-3.2 12,-3.2 ; 0,-2.5 -2,-2.5 -2,2.5 0,2.5 0,3.2 12,3.2
Mechanical 40:
  lines w0.127: -19.5,-5.5 -2.5,-5.5 -2.5,-4.5 ; -19.5,5.5 -2.5,5.5 -2.5,4.5 ; -2.5,-4.5 -2.5,4.5 ; -2.5,-4.5 -2,-4.5 -2,4.5 -2.5,4.5

## 32QN2 [mm]
pads (33):
  rrect50% 0.7x0.25 smd: 1(-2.45,1.75) 2(-2.45,1.25) 3(-2.45,0.75) 4(-2.45,0.25) 5(-2.45,-0.25) 6(-2.45,-0.75) 7(-2.45,-1.25) 8(-2.45,-1.75) 17(2.45,-1.75) 18(2.45,-1.25) 19(2.45,-0.75) 20(2.45,-0.25) 21(2.45,0.25) 22(2.45,0.75) 23(2.45,1.25) 24(2.45,1.75)
  rrect50% 0.25x0.7 smd: 9(-1.75,-2.45) 10(-1.25,-2.45) 11(-0.75,-2.45) 12(-0.25,-2.45) 13(0.25,-2.45) 14(0.75,-2.45) 15(1.25,-2.45) 16(1.75,-2.45) 25(1.75,2.45) 26(1.25,2.45) 27(0.75,2.45) 28(0.25,2.45) 29(-0.25,2.45) 30(-0.75,2.45) 31(-1.25,2.45) 32(-1.75,2.45)
  rect 3.3x3.3 smd paste-1.65: 33(0,0)
Top Paste:
  rectangle: -1.5,0.9 -0.9,1.5
  rectangle: -0.7,0.9 -0.1,1.5
  rectangle: 0.1,0.9 0.7,1.5
  rectangle: 0.9,0.9 1.5,1.5
  rectangle: -1.5,0.1 -0.9,0.7
  rectangle: -1.5,-0.7 -0.9,-0.1
  rectangle: -1.5,-1.5 -0.9,-0.9
  rectangle: -0.7,-1.5 -0.1,-0.9
  rectangle: -0.7,-0.7 -0.1,-0.1
  rectangle: -0.7,0.1 -0.1,0.7
  rectangle: 0.1,0.1 0.7,0.7
  rectangle: 0.1,-0.7 0.7,-0.1
  rectangle: 0.1,-1.5 0.7,-0.9
  rectangle: 0.9,-1.5 1.5,-0.9
  rectangle: 0.9,-0.7 1.5,-0.1
  rectangle: 0.9,0.1 1.5,0.7
Mechanical 2:
  circle w0.406: c-2.7,2.6 r0.1
  lines w0.203: -2.5,-2.2 -2.5,-2.5 -2.2,-2.5 ; -2.5,2.2 -2.5,2.5 -2.2,2.5 ; 2.2,-2.5 2.5,-2.5 2.5,-2.2 ; 2.2,2.5 2.5,2.5 2.5,2.2
Mechanical 18:
  lines w0.203: -2.5,1.9 -2.5,-2.5 2.5,-2.5 2.5,2.5 -1.9,2.5 ; -2.5,1.9 -2.5,2.5 -1.9,2.5 ; -2.5,1.9 -1.9,2.5